# Altium footprint library MS-Electronic.PcbLib: 202 footprints (part 11 of 13)
Each footprint in its own frame and in the unit in brackets; x right, y up, seen from the top. Pads: shape width x height; smd on the part's side, far side on the other; paste and mask are expansions set on the pad; w line width, h text height; cw(c..) or ccw(c..) is an arc to the next point about the centre after c.
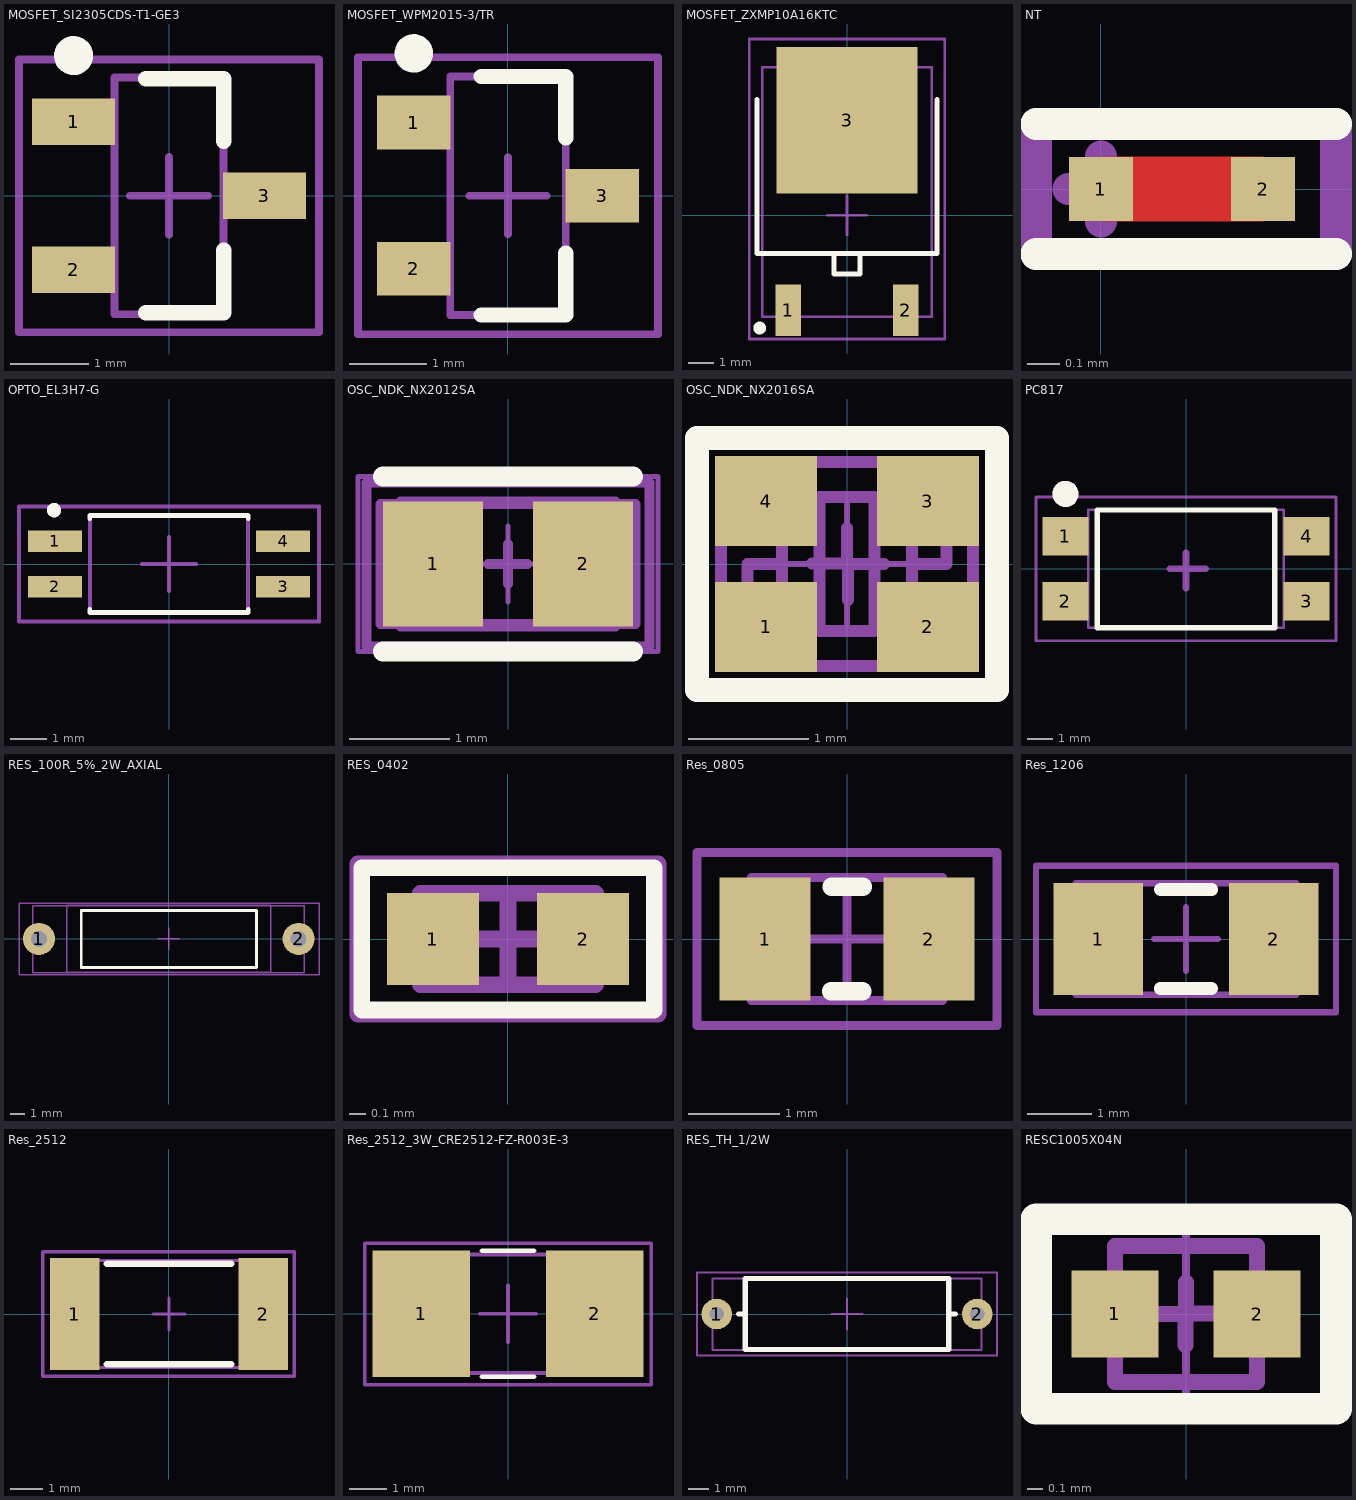
[diagram p10: the footprints below, top view; thin cyan lines are the x and y axes]

## MOSFET_SI2305CDS-T1-GE3 [mm]
height 1.12
pads (3):
  rect 1.07x0.6 smd: 1(-1.225,0.95) 2(-1.225,-0.95) 3(1.225,0)
Top Overlay:
  circle w0.25: c-1.225,1.8 r0.125
  lines w0.2: -0.3,-1.5 0.7,-1.5 0.7,-0.7 ; -0.3,1.5 0.7,1.5 0.7,0.7
Top Assembly:
  lines w0.1: -0.7,-1.52 -0.7,1.52 0.7,1.52 0.7,-1.52 -0.7,-1.52
  text ".Designator" at -2.999,-0.2 h0.6
Top Component Center (Mech15):
  lines w0.1: -0.5,0 0.5,0 ; 0,-0.5 0,0.5 ; -1.925,-1.75 -1.925,1.75 1.925,1.75 1.925,-1.75 -1.925,-1.75
3D body "MOSFET_SI2305CDS-T1-GE3.step": height 1.12, standoff 0, extent -1.32,-1.52 1.32,1.52

## MOSFET_WPM2015-3/TR [mm]
height 1.3
pads (3):
  rect 0.95x0.7 smd: 1(-1.225,0.95) 2(-1.225,-0.95) 3(1.225,0)
Top Overlay:
  circle w0.25: c-1.225,1.85 r0.125
  lines w0.2: -0.35,-1.55 0.75,-1.55 0.75,-0.75 ; -0.35,1.55 0.75,1.55 0.75,0.75
Top Assembly:
  lines w0.1: -0.75,-1.55 -0.75,1.55 0.75,1.55 0.75,-1.55 -0.75,-1.55
  text ".Designator" at -2.999,-0.2 h0.6
Top Component Center (Mech15):
  lines w0.1: -0.5,0 0.5,0 ; 0,-0.5 0,0.5 ; -1.95,-1.8 -1.95,1.8 1.95,1.8 1.95,-1.8 -1.95,-1.8
3D body: height 1.3, standoff 0, extent -0.75,-1.55 0.75,1.55

## MOSFET_ZXMP10A16KTC [mm]
pads (3):
  rect 1x2 smd mask+0.07: 1(-2.285,-3.7) 2(2.285,-3.7)
  rect 5.5x5.7 smd mask+0.07: 3(0,3.7)
Top Overlay:
  circle w0.25: c-3.4,-4.4 r0.125
  lines w0.2: -3.5,4.5 -3.5,-1.5 3.5,-1.5 3.5,4.5 ; -2.8,-1.5 -1.8,-1.5 ; 1.8,-1.5 2.8,-1.5 ; -0.5,-2.3 -0.5,-1.5 0.5,-1.5 0.5,-2.3 -0.5,-2.3
Top Assembly:
  lines w0.1: -3.303,-3.959 -3.303,5.756 3.302,5.756 3.302,-3.959 -3.303,-3.959
  text ".Designator" at -2.499,-0.167 h0.5
Top Component Center (Mech15):
  lines w0.1: -0.762,0 0,0 ; 0,-0.762 0,0 ; 0,0.762 0,0 ; 0.762,0 0,0 ; -3.81,-4.826 -3.81,6.858 3.81,6.858 3.81,-4.826 -3.81,-4.826
3D body "DPAK.stp": height 2.31, standoff 0, extent -3.3,-3.951 3.3,5.762

## NT [mm]
pads (2):
  rect 0.2x0.2 smd mask+0.102: 1(0,0) 2(0.508,0)
Top Layer:
  region: 0,-0.102 0.508,-0.102 0.508,0.102 0,0.102
Top Overlay:
  lines w0.1: -0.203,-0.203 0.737,-0.203 ; -0.203,0.203 0.737,0.203
Top Assembly:
  lines w0.1: -0.203,-0.203 0.737,-0.203 0.737,0.203 -0.203,0.203 -0.203,-0.203
  text ".Designator" at -1,-0.067 h0.2
Top Component Center (Mech15):
  lines w0.1: -0.102,0 0,0 ; 0,-0.102 0,0 ; 0,0.102 0,0 ; 0.102,0 0,0 ; -0.203,-0.203 -0.203,0.203 0.737,0.203 0.737,-0.203 -0.203,-0.203

## OPTO_EL3H7-G [mm]
pads (4):
  rect 1.5x0.6 smd mask+0.07: 1(-3.175,0.635) 2(-3.175,-0.635) 3(3.175,-0.635) 4(3.175,0.635)
Top Overlay:
  circle w0.2: c-3.2,1.499 r0.1
  lines w0.127: -2.2,-1.255 -2.2,-1.35 2.2,-1.35 2.2,-1.255 ; -2.2,1.255 -2.2,1.35 2.2,1.35 2.2,1.255
Top Assembly:
  circle w0.2: c-3.2,1.499 r0.1
  lines w0.1: -2.2,-1.35 2.2,-1.35 2.2,1.35 -2.2,1.35 -2.2,-1.35
  text ".Designator" at -2.499,-0.167 h0.5
Top Component Center (Mech15):
  lines w0.1: -0.762,0 0,0 ; 0,-0.762 0,0 ; 0,0.762 0,0 ; 0.762,0 0,0 ; -4.175,-1.6 -4.175,1.6 4.175,1.6 4.175,-1.6 -4.175,-1.6
3D body "User Library-SSOP-4.STEP": height 2, standoff -0.02, extent -3.5,-1.397 3.5,1.303

## OSC_NDK_NX2012SA [mm] "Crystal, 2-Leads, Body 2.05x1.20x0.55mm (Tol:-/+0.05)"
height 0.55
pads (2):
  rect 1x1.25 smd: 1(-0.75,0) 2(0.75,0)
Top Overlay:
  lines w0.2: -1.25,-0.875 1.25,-0.875 ; -1.25,0.875 1.25,0.875
Top Assembly:
  lines w0.1: -1.275,-0.6 1.275,-0.6 1.275,0.6 -1.275,0.6 -1.275,-0.6
  text ".Designator" at -2.499,-0.167 h0.5
Bottom 3D Body:
  lines w0.1: -1.275,-0.4 cw(c-1.275,-0.6) -1.077,-0.625 1.077,-0.625 cw(c1.275,-0.6) 1.275,-0.4 1.275,0.4 cw(c1.275,0.6) 1.077,0.625 -1.077,0.625 cw(c-1.275,0.6) -1.275,0.4 -1.275,-0.4
Top Component Center (Mech15):
  lines w0.1: -0.2,0.001 0,0.001 0,0.2 ; -0.003,0.002 0.197,0.002 ; -0.002,-0.198 -0.002,0.002 ; -1.417,-0.825 -1.417,0.813 1.416,0.813 1.416,-0.825 -1.417,-0.825
Mechanical 17:
  lines w0.05: -0.381,0 0.381,0 ; 0,-0.381 0,0.381 ; -1.5,-0.875 -1.5,0.875 1.5,0.875 1.5,-0.875 -1.5,-0.875
3D body: height 0.55, standoff 0, extent -1.038,-0.625 1.025,0.625

## OSC_NDK_NX2016SA [mm] "Crystal, 4-Leads, Body 2.10x1.61x0.50mm (max), Pitch 1.35x1.05mm"
height 0.45
pads (4):
  rect 0.85x0.75 smd: 1(-0.675,-0.525) 2(0.675,-0.525) 3(0.675,0.525) 4(-0.675,0.525)
Top Overlay:
  lines w0.2: -1.25,-1.05 -1.25,1.05 1.25,1.05 1.25,-1.05 -1.25,-1.05
  text "." at -1.494,-1.538 h4
Top Assembly:
  lines w0.1: -1.05,-0.85 1.05,-0.85 1.05,0.85 -1.05,0.85 -1.05,-0.85
  text ".Designator" at -2.499,-0.167 h0.5
Bottom 3D Body:
  lines w0.1: -0.83,-0.45 -0.83,0 -0.54,0 ; -0.54,-0.3 -0.54,0.3 ; 0.54,-0.3 0.54,0.3 ; 0.54,0 0.83,0 0.83,0.45 ; -1.05,-0.65 cw(c-1.05,-0.85) -0.85,-0.85 0.85,-0.85 cw(c1.05,-0.85) 1.05,-0.65 1.05,0.65 cw(c1.05,0.85) 0.85,0.85 -0.85,0.85 cw(c-1.05,0.85) -1.05,0.65 -1.05,-0.65 ; -0.23,-0.56 0.23,-0.56 0.23,0.56 -0.23,0.56 -0.23,-0.56
  text "." at -0.7,-0.7 h3
Top Component Center (Mech15):
  lines w0.1: -0.294,0.003 0.006,0.003 ; 0,0 0,0.3 ; 0.006,-0.3 0.006,0 0.306,0 ; -1.25,-1.05 1.25,-1.05 1.25,1.05 -1.25,1.05 -1.25,-1.05
Mechanical 17:
  lines w0.05: -0.5,0 0.5,0 ; 0,-0.5 0,0.5 ; -1.25,-1.05 -1.25,1.05 1.25,1.05 1.25,-1.05 -1.25,-1.05
3D body "OSC_NDK_NX2016SA.STEP": height 0.5, standoff 0, extent -1,-0.8 1,0.8

## PC817 [mm]
pads (4):
  rect 1.79x1.5 smd: 1(-4.705,1.27) 2(-4.705,-1.27) 3(4.705,-1.27) 4(4.705,1.27)
Top Overlay:
  circle w0.508: c-4.699,2.921 r0.254
  lines w0.2: -3.46,-2.3 -3.46,2.3 3.46,2.3 3.46,-2.3 -3.46,-2.3
Top Assembly:
  circle w0.508: c-4.699,2.921 r0.254
  lines w0.1: -3.81,-2.3 -3.81,2.3 3.81,2.3 3.81,-2.3 -3.81,-2.3
  text "'.Designator'" at -8.887,-1.397 h1.52
Top Component Center (Mech15):
  lines w0.1: -5.85,-2.8 -5.85,2.8 5.85,2.8 5.85,-2.8 -5.85,-2.8
  lines w0.254: -0.635,0 0.762,0 ; 0,-0.762 0,0.635 0,0
3D body "User Library-PC817_Gullwing.STEP": height 3.86, standoff 0.01, extent -5,-2.29 5,2.29

## RES_100R_5%_2W_AXIAL [mm]
pads (2):
  round 2.2 hole 1.1: 1(-8.9,0) 2(8.9,0)
Top Overlay:
  lines w0.2: -6,-1.95 -6,1.95 6,1.95 6,-1.95 -6,-1.95
Top Assembly:
  lines w0.1: -9.322,-2.311 -9.322,2.286 9.271,2.286 9.271,-2.311 -9.322,-2.311
  text ".Designator" at -2.499,-0.167 h0.5
Top Component Center (Mech15):
  lines w0.1: -0.762,0 0,0 ; 0,-0.762 0,0 ; 0,0.762 0,0 ; 0.762,0 0,0 ; -10.265,-2.465 10.295,-2.469 10.295,2.448 -10.265,2.452 -10.265,-2.465
Mechanical 38:
  lines w0.1: -7,-2.3 -7,2.3 7,2.3 7,-2.3 -7,-2.3
3D body "RES_AH_1W_700mil_0R_5%.STEP": height 4.78, standoff -4.7, extent -9.29,-2.277 9.29,2.277

## RES_0402 [mm]
height 0.4
pads (2):
  rect 0.55x0.55 smd: 1(-0.45,0) 2(0.45,0)
Top Overlay:
  lines w0.1: -0.877,-0.426 -0.877,0.427 0.878,0.427 0.878,-0.426 -0.877,-0.426
Top Assembly:
  lines w0.1: -0.525,-0.275 -0.525,0.275 0.525,0.275 0.525,-0.275 -0.525,-0.275
  text ".Designator" at -1.1,-0.073 h0.22
Top Component Center (Mech15):
  lines w0.1: -0.275,0 0.275,0 ; 0,-0.275 0,0.275 ; -0.9,-0.45 -0.9,0.45 0.9,0.45 0.9,-0.45 -0.9,-0.45
3D body "Res_RC0402JR-0710KL.step": height 0.4, standoff 0, extent -0.525,-0.275 0.525,0.275

## Res_0805 [mm]
height 0.6
pads (2):
  rect 1x1.35 smd: 1(-0.9,0) 2(0.9,0)
Top Overlay:
  lines w0.2: -0.176,-0.575 0.172,-0.575 ; -0.172,0.575 0.176,0.575
Top Assembly:
  lines w0.1: -1.05,-0.675 -1.05,0.675 1.05,0.675 1.05,-0.675 -1.05,-0.675
  text ".Designator" at -2.499,-0.167 h0.5
Top Component Center (Mech15):
  lines w0.1: -0.5,0 0.5,0 ; 0,-0.5 0,0.5 ; -1.65,-0.95 -1.65,0.95 1.65,0.95 1.65,-0.95 -1.65,-0.95
3D body "Res_0805.step": height 0.6, standoff 0, extent -1.05,-0.675 1.05,0.675

## Res_1206 [mm]
height 0.7
pads (2):
  rect 1.4x1.75 smd: 1(-1.375,0) 2(1.375,0)
Top Overlay:
  lines w0.2: -0.403,-0.775 0.401,-0.775 ; -0.401,0.775 0.403,0.775
Top Assembly:
  lines w0.1: -1.725,-0.875 -1.725,0.875 1.725,0.875 1.725,-0.875 -1.725,-0.875
  text ".Designator" at -2.999,-0.2 h0.6
Top Component Center (Mech15):
  lines w0.1: -0.5,0 0.5,0 ; 0,-0.5 0,0.5 ; -2.35,-1.15 -2.35,1.15 2.35,1.15 2.35,-1.15 -2.35,-1.15
3D body "Res_1206.step": height 0.7, standoff 0, extent -1.725,-0.875 1.725,0.875

## Res_2512 [mm]
height 0.65
pads (2):
  rect 1.55x3.5 smd: 1(-2.95,0) 2(2.95,0)
Top Overlay:
  lines w0.2: -1.95,-1.575 1.95,-1.575 ; -1.95,1.575 1.95,1.575
Top Assembly:
  lines w0.1: -3.225,-1.675 3.225,-1.675 3.225,1.675 -3.225,1.675 -3.225,-1.675
  text ".Designator" at -2.999,-0.2 h0.6
Top Component Center (Mech15):
  lines w0.1: -0.5,0 0.5,0 ; 0,-0.5 0,0.5 ; -3.955,-1.95 3.927,-1.95 3.927,1.95 -3.955,1.95 -3.955,-1.95
3D body "Res_2512.step": height 0.65, standoff 0, extent -3.225,-1.675 3.225,1.675

## Res_2512_3W_CRE2512-FZ-R003E-3 [mm]
pads (2):
  rect 2.64x3.42 smd: 1(-2.34,0) 2(2.34,0)
Top Overlay:
  lines w0.127: -0.7,-1.7 0.7,-1.7 ; -0.7,1.7 0.7,1.7
Top Assembly:
  lines w0.1: -3.2,-1.598 -3.2,1.6 3.203,1.6 3.203,-1.598 -3.2,-1.598
  text ".Designator" at -2.499,-0.167 h0.5
Top Component Center (Mech15):
  lines w0.1: -0.762,0 0,0 ; 0,-0.762 0,0 ; 0,0.762 0,0 ; 0.762,0 0,0 ; -3.866,-1.913 -3.866,1.904 3.864,1.904 3.864,-1.913 -3.866,-1.913
3D body "step_temp.STEP": height 0.9, standoff 0, extent -3.2,-1.6 3.2,1.6

## RES_TH_1/2W [mm]
pads (2):
  round 1.5 hole 0.7: 1(-6.4,0) 2(6.4,0)
Top Overlay:
  lines w0.254: -5.334,0 -5.08,0 ; 5.08,0 5.334,0 ; -5,-1.75 5,-1.75 5,1.75 -5,1.75 -5,-1.75
Top Assembly:
  lines w0.1: -6.604,-1.778 6.604,-1.778 6.604,1.744 -6.604,1.744 -6.604,-1.778
  text ".Designator" at -4.998,-0.333 h1
Top Component Center (Mech15):
  lines w0.1: -0.762,0 0,0 ; 0,-0.762 0,0 ; 0,0.762 0,0 ; 0.762,0 0,0 ; -7.366,-2.032 -7.366,2.032 7.366,2.032 7.366,-2.032 -7.366,-2.032
3D body "Resistro_0.5w.STEP": height 3.5, standoff -3, extent -6.62,-1.75 6.62,1.75

## RESC1005X04N [mm] "Chip Resistor, 2-Leads, Body 1.00x0.50mm (0402)"
height 0.4
pads (2):
  rect 0.55x0.55 smd: 1(-0.45,0) 2(0.45,0)
Top Overlay:
  lines w0.2: -0.95,-0.6 -0.95,0.6 0.95,0.6 0.95,-0.6 -0.95,-0.6
Top Assembly:
  lines w0.1: -0.45,-0.43 0.45,-0.43 0.45,0.43 -0.45,0.43 -0.45,-0.43
  text ".Designator" at -2.499,-0.167 h0.5
Top Component Center (Mech15):
  lines w0.1: -0.203,0.001 -0.003,0.001 ; -0.003,-0.198 -0.003,0.002 ; -0.003,0.004 0.197,0.004 ; 0,0 0,0.2 ; -0.95,-0.6 0.95,-0.6 0.95,0.6 -0.95,0.6 -0.95,-0.6
Mechanical 17:
  lines w0.05: -0.5,0 0.5,0 ; 0,-0.5 0,0.5 ; -0.9,-0.525 -0.9,0.525 0.9,0.525 0.9,-0.525 -0.9,-0.525
3D body "RESC1005X04N.step": height 0.35, standoff 0, extent -0.5,-0.25 0.5,0.25